# Altium footprint library Inductors&Transformers.PcbLib: 69 footprints (part 3 of 5)
Each footprint in its own frame and in the unit in brackets; x right, y up, seen from the top. Pads: shape width x height; smd on the part's side, far side on the other; paste and mask are expansions set on the pad; w line width, h text height; cw(c..) or ccw(c..) is an arc to the next point about the centre after c.
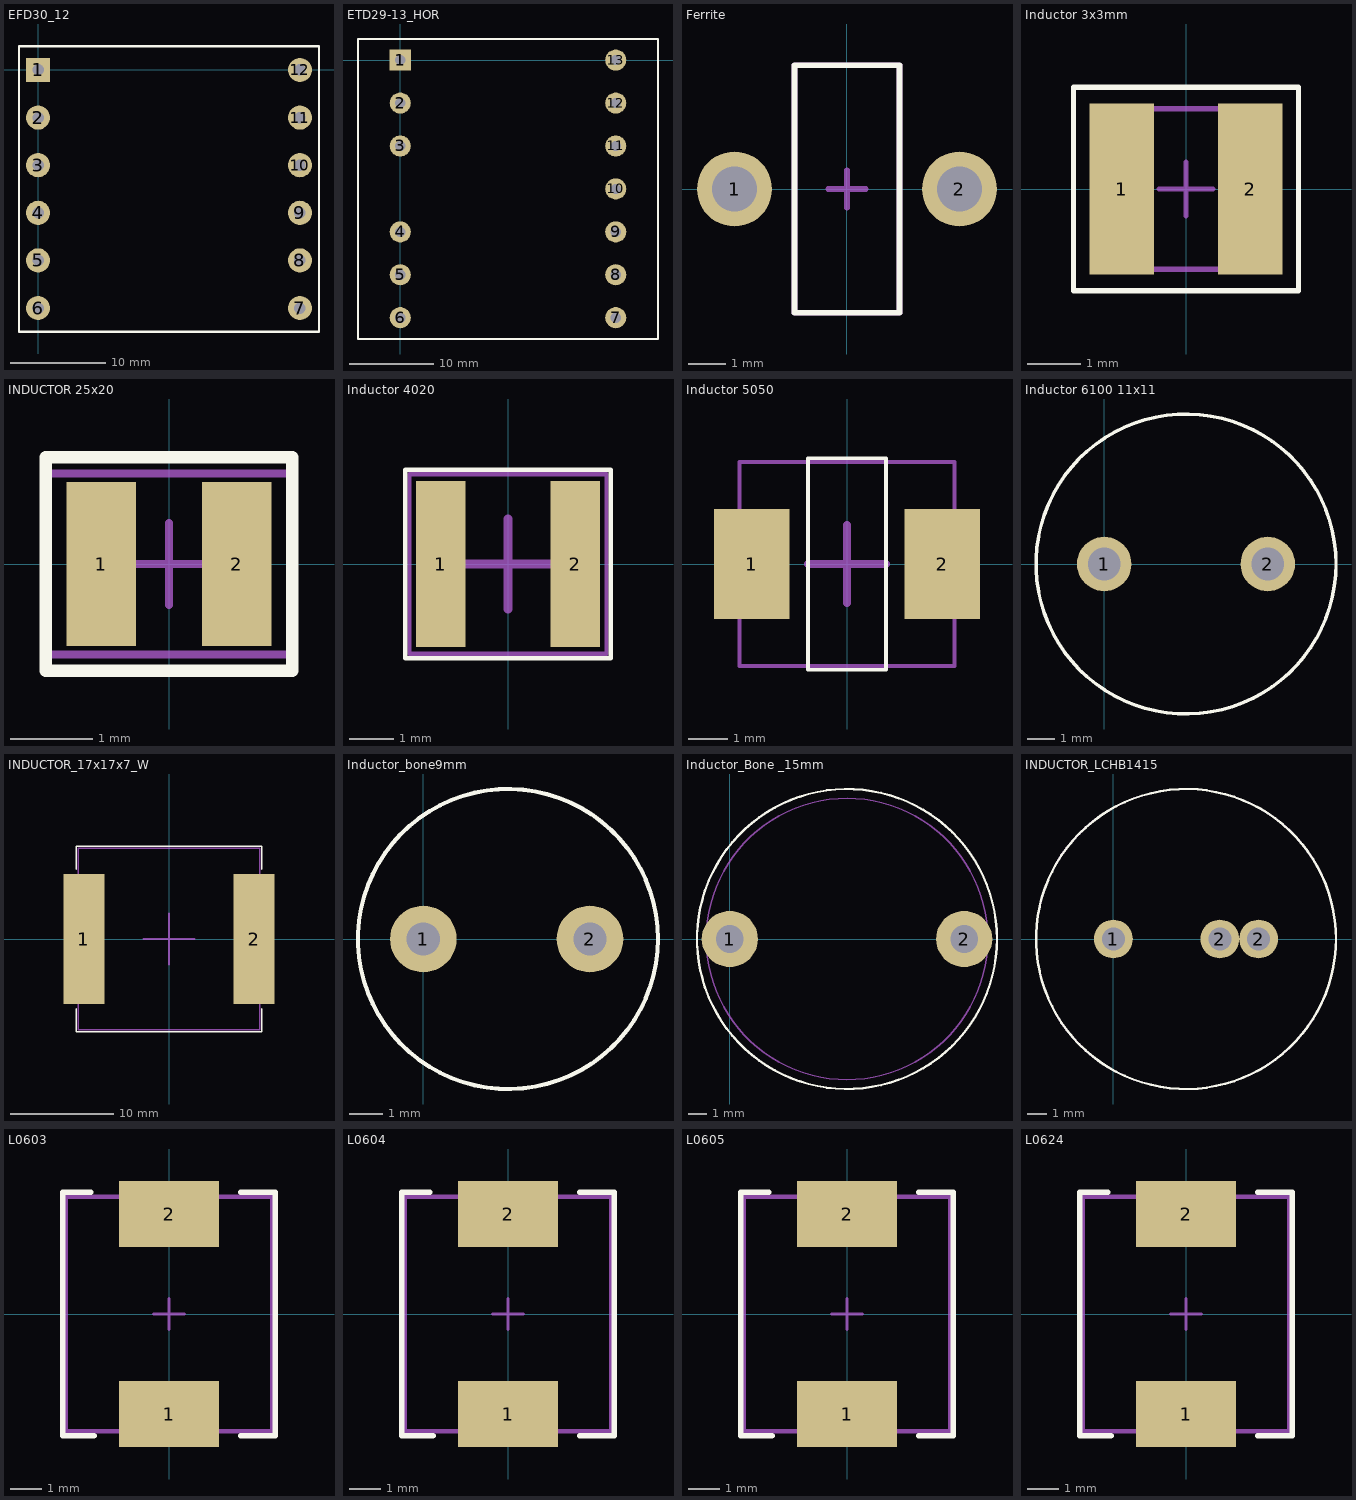
[diagram p2: the footprints below, top view; thin cyan lines are the x and y axes]

## EFD30_12 [mm]
height 13.487
pads (12):
  rect 2.54x2.54 hole 1.2: 1(0,0)
  round 2.54 hole 1.2: 2(0,-5) 3(0,-10) 4(0,-15) 5(0,-20) 6(0,-25) 7(27.5,-25) 8(27.5,-20) 9(27.5,-15) 10(27.5,-10) 11(27.5,-5) 12(27.5,0)
Top Overlay:
  lines w0.254: -2,-27.5 29.5,-27.5 29.5,2.5 -2,2.5 -2,-27.5
3D body "User Library-EFD30-1.step": height 13, standoff -3.1, extent -3.25,-28.1 30.75,3.1

## ETD29-13_HOR [mm]
height 25.5
pads (13):
  rect 2.5x2.5 hole 1.2: 1(0,0)
  round 2.5 hole 1.2: 2(0,-5.08) 3(0,-10.16) 4(0,-20.32) 5(0,-25.4) 6(0,-30.48) 7(25.5,-30.48) 8(25.5,-25.4) 9(25.5,-20.32) 10(25.5,-15.24) 11(25.5,-10.16) 12(25.5,-5.08) 13(25.5,0)
Top Overlay:
  lines w0.254: -5,-33 30.5,-33 30.5,2.5 -5,2.5 -5,-33
3D body "User Library-ETD29.STEP": height 24.71, standoff -3.4, extent -4.75,-32.85 30.25,2.35

## Ferrite [mm]
pads (2):
  round 2 hole 1.2: 1(-3,0) 2(3,0)
Top Overlay:
  lines w0.15: -1.4,-3.3 1.4,-3.3 1.4,3.3 -1.4,3.3 -1.4,-3.3
Mechanical 13:
  lines w0.15: -0.5,0 0.5,0 ; 0,-0.5 0,0.5 ; -1.4,-3.3 -1.4,3.3 1.4,3.3 1.4,-3.3 -1.4,-3.3

## Inductor 3x3mm [mm]
height 1
pads (2):
  rect 1.2x3.2 smd: 1(-1.2,0) 2(1.2,0)
Top Overlay:
  lines w0.1: -2.1,-1.9 -2.1,1.9 2.1,1.9 2.1,-1.9 -2.1,-1.9
Mechanical 13:
  lines w0.1: -0.5,0 0.5,0 ; 0,-0.5 0,0.5 ; -1.5,-1.5 1.5,-1.5 1.5,1.5 -1.5,1.5 -1.5,-1.5
3D body "User Library-Murata_LQH3NP_M0(1212).step": height 1.4, standoff -0.01, extent -1.51,-1.5 1.51,1.5

## INDUCTOR 25x20 [mm]
pads (2):
  rect 0.85x2 smd: 1(-0.825,0) 2(0.825,0)
Top Overlay:
  lines w0.15: -1.5,-1.3 1.5,-1.3 1.5,1.3 -1.5,1.3 -1.5,-1.3
Mechanical 13:
  lines w0.1: -0.5,0 0.5,0 ; 0,-0.5 0,0.5 ; -1.5,-1.1 1.5,-1.1 1.5,1.1 -1.5,1.1 -1.5,-1.1

## Inductor 4020 [mm]
pads (2):
  rect 1.1x3.7 smd: 1(-1.5,0) 2(1.5,0)
Top Overlay:
  lines w0.1: -2.3,-2.1 2.3,-2.1 2.3,2.1 -2.3,2.1 -2.3,-2.1
Mechanical 13:
  lines w0.1: -2.2,-2 2.2,-2 2.2,2 -2.2,2 -2.2,-2
  lines w0.2: -1,0 1,0 ; 0,-1 0,1

## Inductor 5050 [mm]
height 2
pads (2):
  rect 1.92x2.8 smd: 1(-2.43,0) 2(2.43,0)
Top Overlay:
  lines w0.1: -1,-2.7 -1,2.7 1,2.7 1,-2.7 -1,-2.7
Mechanical 13:
  lines w0.1: -2.75,-2.6 2.75,-2.6 2.75,2.6 -2.75,2.6 -2.75,-2.6
  lines w0.2: -1,0 1,0 ; 0,-1 0,1
3D body "ihlp2020bzer6r8m01.stp": height 1.95, standoff 0.03, extent -2.751,-2.573 2.7,2.573

## Inductor 6100 11x11 [mm]
height 11
pads (2):
  round 2 hole 1.2: 1(0,0) 2(6,0)
Top Overlay:
  circle w0.127: c3,0 r5.5
Mechanical 13:
  circle w0.076: c3,0 r5.5
3D body "Coilcraft-DC1012.step": height 16.2, standoff -3, extent -2,-5 8,5

## INDUCTOR_17x17x7_W [mm]
height 7
pads (2):
  rect 4x12.6 smd: 1(-8.25,0) 2(8.25,0)
Top Overlay:
  lines w0.15: -9,-6.75 -9,-9 9,-9 9,-6.75 ; -9,6.75 -9,9 9,9 9,6.75
Mechanical 15:
  lines w0.15: -2.5,0 2.5,0 ; 0,-2.5 0,2.5 ; -8.8,-8.8 8.8,-8.8 8.8,8.8 -8.8,8.8 -8.8,-8.8
3D body "User Library-SRP1770TA.step": height 6.7, standoff 0, extent -8.7,-8.45 8.7,8.45

## Inductor_bone9mm [mm]
height 10
pads (2):
  round 2 hole 1: 1(0,0) 2(5,0)
Top Overlay:
  circle w0.127: c2.54,0 r4.5
Mechanical 13:
  circle w0.076: c2.54,0 r4.5
3D body: height 10, standoff 0, extent -1.959,-4.499 7.039,4.499

## Inductor_Bone _15mm [mil]
height 433
pads (2):
  round 120 hole 59.06: 1(0,0) 2(500,0)
Top Overlay:
  circle w5: c250,0 r320
Mechanical 13:
  circle w3: c250,0 r300
3D body: height 433, standoff 0, extent -69.98,-319.98 569.98,319.98

## INDUCTOR_LCHB1415 [mm]
height 18
pads (3):
  round 2 hole 1.2: 1(0,0) 2(5.5,0) 2(7.5,0)
Top Overlay:
  circle w0.127: c3.75,0 r7.75
Mechanical 13:
  circle w0.076: c3.75,0 r7.75
3D body: height 18, standoff 0, extent -3.999,-7.749 11.499,7.749

## L0603 [mm] "Power SMD inductors, 7.4mm x 6.6mm x 3mm. So like CKST0603, FLIHP 0630, etc. core inductors."
height 3
pads (2):
  rect 3.2x2.1 smd: 1(0,-3.2) 2(0,3.2)
Top Overlay:
  lines w0.178: -2.5,3.9 -3.4,3.9 -3.4,-3.9 -2.4,-3.9 ; 2.3,-3.9 3.4,-3.9 3.4,3.9 2.3,3.9
Mechanical 15:
  lines w0.1: -0.5,0 0.5,0 ; 0,-0.5 0,0.5
  lines w0.15: -3.3,-3.75 3.3,-3.75 3.3,3.75 -3.3,3.75 -3.3,-3.75
3D body "User Library-L0603.step": height 3, standoff 0, extent -3.3,-3.7 3.3,3.7

## L0604 [mm] "Power SMD inductors, 7.4mm x 6.6mm x 4mm. So like CKST0604, FLIHP 0640, etc. core inductors."
height 4
pads (2):
  rect 3.2x2.1 smd: 1(0,-3.2) 2(0,3.2)
Top Overlay:
  lines w0.178: -2.5,3.9 -3.4,3.9 -3.4,-3.9 -2.4,-3.9 ; 2.3,-3.9 3.4,-3.9 3.4,3.9 2.3,3.9
Mechanical 15:
  lines w0.1: -0.5,0 0.5,0 ; 0,-0.5 0,0.5
  lines w0.15: -3.3,-3.75 3.3,-3.75 3.3,3.75 -3.3,3.75 -3.3,-3.75
3D body "User Library-L0604.step": height 4, standoff 0, extent -3.3,-3.7 3.3,3.7

## L0605 [mm] "Power SMD inductors, 7.4mm x 6.6mm x 3mm. So like CKST0605, FLIHP 0650, etc. core inductors."
height 5
pads (2):
  rect 3.2x2.1 smd: 1(0,-3.2) 2(0,3.2)
Top Overlay:
  lines w0.178: -2.5,3.9 -3.4,3.9 -3.4,-3.9 -2.4,-3.9 ; 2.3,-3.9 3.4,-3.9 3.4,3.9 2.3,3.9
Mechanical 15:
  lines w0.1: -0.5,0 0.5,0 ; 0,-0.5 0,0.5
  lines w0.15: -3.3,-3.75 3.3,-3.75 3.3,3.75 -3.3,3.75 -3.3,-3.75
3D body "User Library-L0605.step": height 5, standoff 0, extent -3.3,-3.7 3.3,3.7

## L0624 [mm] "Power SMD inductors, 7.4mm x 6.6mm x 2.4mm. So like CKST0624, etc. core inductors."
height 2.4
pads (2):
  rect 3.2x2.1 smd: 1(0,-3.2) 2(0,3.2)
Top Overlay:
  lines w0.178: -2.5,3.9 -3.4,3.9 -3.4,-3.9 -2.4,-3.9 ; 2.3,-3.9 3.4,-3.9 3.4,3.9 2.3,3.9
Mechanical 15:
  lines w0.1: -0.5,0 0.5,0 ; 0,-0.5 0,0.5
  lines w0.15: -3.3,-3.75 3.3,-3.75 3.3,3.75 -3.3,3.75 -3.3,-3.75
3D body "User Library-L0624.step": height 2.4, standoff 0, extent -3.3,-3.7 3.3,3.7